# Altium footprint library LTEWlib.PcbLib: 125 footprints (part 2 of 8)
Each footprint in its own frame and in the unit in brackets; x right, y up, seen from the top. Pads: shape width x height; smd on the part's side, far side on the other; paste and mask are expansions set on the pad; w line width, h text height; cw(c..) or ccw(c..) is an arc to the next point about the centre after c.
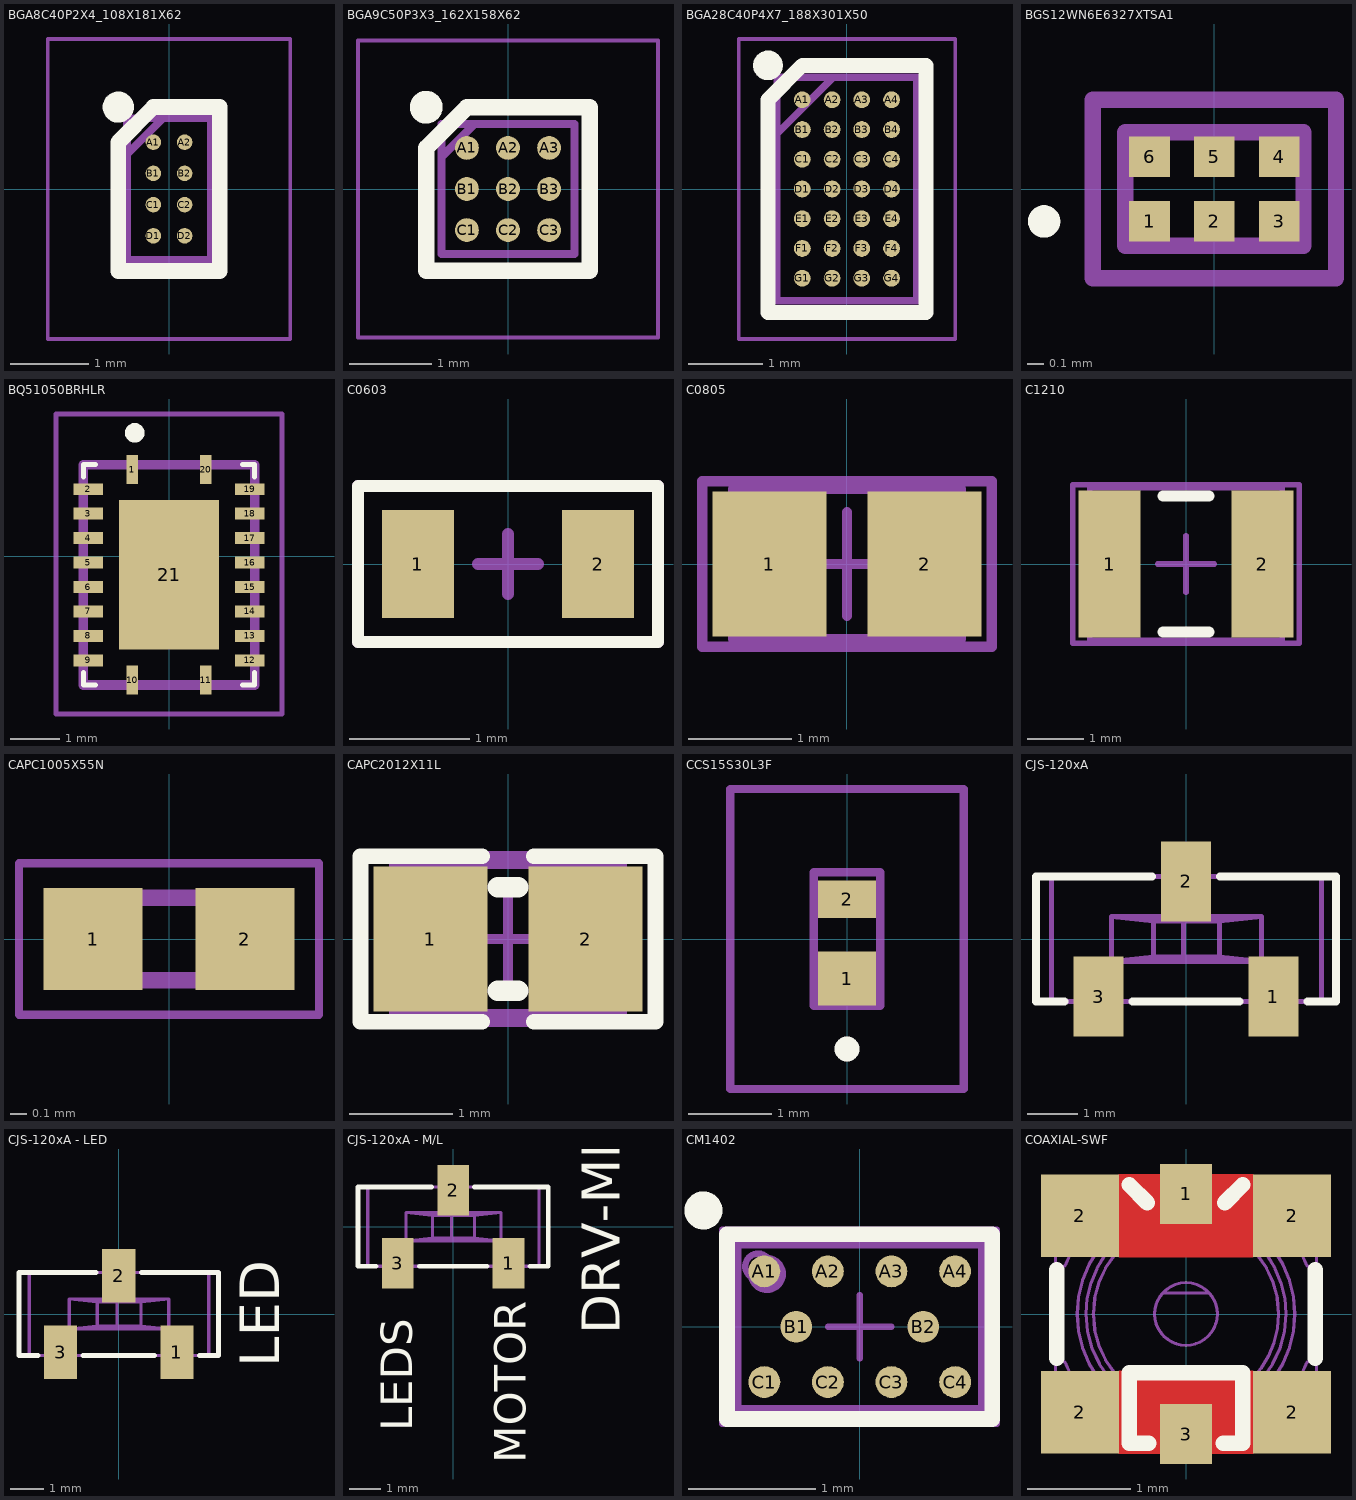
[diagram p1: the footprints below, top view; thin cyan lines are the x and y axes]

## BGA8C40P2X4_108X181X62 [mm]
pads (8):
  round 0.2 smd: A1(-0.2,0.6) A2(0.2,0.6) B1(-0.2,0.2) B2(0.2,0.2) C1(-0.2,-0.2) C2(0.2,-0.2) D1(-0.2,-0.6) D2(0.2,-0.6)
Top Overlay:
  circle w0.2: c-0.65,1.05 r0.1
  lines w0.2: -0.65,-1.05 0.65,-1.05 0.65,1.05 -0.2,1.05 -0.65,0.6 -0.65,-1.05
Mechanical 13:
  lines w0.1: -0.538,0.446 -0.077,0.907 ; -0.538,-0.907 0.538,-0.907 0.538,0.907 -0.538,0.907 -0.538,-0.907
Mechanical 15:
  lines w0.05: -1.553,-1.922 1.553,-1.922 1.553,1.922 -1.553,1.922 -1.553,-1.922
3D body "TPS63036YFGT.stp": height 0.63, standoff 0, extent -0.538,-0.907 0.538,0.907

## BGA9C50P3X3_162X158X62 [mm]
pads (9):
  round 0.29 smd: A1(-0.5,0.5) A2(0,0.5) A3(0.5,0.5) B1(-0.5,0) B2(0,0) B3(0.5,0) C1(-0.5,-0.5) C2(0,-0.5) C3(0.5,-0.5)
Top Overlay:
  circle w0.2: c-0.995,0.995 r0.1
  lines w0.2: -0.995,-0.995 0.995,-0.995 0.995,0.995 -0.5,0.995 -0.995,0.5 -0.995,-0.995
Mechanical 13:
  lines w0.1: -0.81,0.388 -0.408,0.79 ; -0.81,-0.79 0.81,-0.79 0.81,0.79 -0.81,0.79 -0.81,-0.79
Mechanical 15:
  lines w0.05: -1.825,-1.805 1.825,-1.805 1.825,1.805 -1.825,1.805 -1.825,-1.805
3D body "BQ27421YZFR-G1A.stp": height 0.63, standoff 0, extent -0.81,-0.79 0.81,0.79

## BGA28C40P4X7_188X301X50 [mm]
pads (28):
  round 0.226 smd: A1(-0.6,1.2) A2(-0.2,1.2) A3(0.2,1.2) A4(0.6,1.2) B1(-0.6,0.8) B2(-0.2,0.8) B3(0.2,0.8) B4(0.6,0.8) C1(-0.6,0.4) C2(-0.2,0.4) C3(0.2,0.4) C4(0.6,0.4) D1(-0.6,0) D2(-0.2,0) D3(0.2,0) D4(0.6,0) E1(-0.6,-0.4) E2(-0.2,-0.4) E3(0.2,-0.4) E4(0.6,-0.4) F1(-0.6,-0.8) F2(-0.2,-0.8) F3(0.2,-0.8) F4(0.6,-0.8) G1(-0.6,-1.2) G2(-0.2,-1.2) G3(0.2,-1.2) G4(0.6,-1.2)
Top Overlay:
  circle w0.2: c-1.063,1.663 r0.1
  lines w0.2: -1.063,-1.663 1.063,-1.663 1.063,1.663 -0.6,1.663 -1.063,1.2 -1.063,-1.663
Mechanical 13:
  lines w0.1: -0.941,0.744 -0.182,1.503 ; -0.941,-1.503 0.941,-1.503 0.941,1.503 -0.941,1.503 -0.941,-1.503
Mechanical 15:
  lines w0.05: -1.456,-2.018 1.457,-2.018 1.457,2.018 -1.456,2.018 -1.456,-2.018
3D body "BQ51003YFPT.stp": height 0.5, standoff 0, extent -0.941,-1.503 0.941,1.503

## BGS12WN6E6327XTSA1 [mm]
pads (6):
  rect 0.25x0.25 smd: 1(-0.4,-0.2) 2(0,-0.2) 3(0.4,-0.2) 4(0.4,0.2) 5(0,0.2) 6(-0.4,0.2)
Top Overlay:
  lines w0.1: -1.1,-0.2 cw(c-1.05,-0.2) -1,-0.2 cw(c-1.05,-0.2) -1.1,-0.2
Mechanical 13:
  lines w0.1: -0.55,-0.35 0.55,-0.35 0.55,0.35 -0.55,0.35 -0.55,-0.35
Mechanical 15:
  lines w0.1: -0.75,-0.55 0.75,-0.55 0.75,0.55 -0.75,0.55 -0.75,-0.55
3D body "BGS12WN6E6327XTSA1.stp": height 0.5, standoff 0, extent -0.55,-0.35 0.55,0.35

## BQ51050BRHLR [mm]
pads (21):
  rect 0.24x0.6 smd: 1(-0.75,1.775) 10(-0.75,-2.525) 11(0.75,-2.525) 20(0.75,1.775)
  rect 0.6x0.24 smd: 2(-1.65,1.375) 3(-1.65,0.875) 4(-1.65,0.375) 5(-1.65,-0.125) 6(-1.65,-0.625) 7(-1.65,-1.125) 8(-1.65,-1.625) 9(-1.65,-2.125) 12(1.65,-2.125) 13(1.65,-1.625) 14(1.65,-1.125) 15(1.65,-0.625) 16(1.65,-0.125) 17(1.65,0.375) 18(1.65,0.875) 19(1.65,1.375)
  rect 2.05x3.05 smd: 21(0,-0.375)
Top Overlay:
  lines w0.1: -1.75,-2.375 -1.75,-2.625 -1.5,-2.625 ; -1.75,1.625 -1.75,1.875 -1.5,1.875 ; 1.5,-2.625 1.75,-2.625 1.75,-2.375 ; 1.5,1.875 1.75,1.875 1.75,1.625
  lines w0.2: -0.8,2.525 ccw(c-0.7,2.525) -0.6,2.525 ccw(c-0.7,2.525) -0.8,2.525
Mechanical 13:
  lines w0.2: -1.75,-2.625 -1.75,1.875 1.75,1.875 1.75,-2.625 -1.75,-2.625
Mechanical 15:
  lines w0.1: -2.306,-3.219 -2.306,2.91 2.306,2.91 2.306,-3.219 -2.306,-3.219
3D body "BQ51013BRHLR.stp": height 1, standoff 0, extent -1.75,-2.67 1.75,1.83

## C0603 [mm] "SMD 0603"
pads (2):
  rect 0.6x0.9 smd: 1(-0.75,0) 2(0.75,0)
Top Overlay:
  lines w0.1: -1.25,-0.65 -1.25,0.65 1.25,0.65 1.25,-0.65 -1.25,-0.65
Top Courtyard:
  lines w0.1: -0.25,0 0,0 ; 0,-0.25 0,0 ; 0,0.25 0,0 ; 0.25,0 0,0 ; -1.25,-0.65 -1.25,0.65 1.25,0.65 1.25,-0.65 -1.25,-0.65
3D body "User Library-0603 SMD Capacitor.step": height 0.3, standoff 0, extent -0.8,-0.4 0.8,0.4

## C0805 [mm] "Chip Capacitor, Body 2.0x1.3mm, IPC High Density"
height 1.4
pads (2):
  rect 1.1x1.4 smd: 1(-0.75,0) 2(0.75,0)
Top Courtyard:
  lines w0.1: -0.5,0 0.5,0 ; 0,-0.5 0,0.5 ; -1.4,-0.8 -1.4,0.8 1.4,0.8 1.4,-0.8 -1.4,-0.8
Top 3D Body:
  lines w0.1: -1.1,-0.725 -1.1,0.725 1.1,0.725 1.1,-0.725 -1.1,-0.725
3D body: height 1.4, standoff 0, extent -1.1,-0.725 1.1,0.725

## C1210 [mm] "Chip Capacitor, Body 3.2x2.5mm, IPC High Density"
height 1.3
pads (2):
  rect 1.1x2.6 smd: 1(-1.35,0) 2(1.35,0)
Top Overlay:
  lines w0.2: -0.4,-1.2 0.4,-1.2 ; -0.4,1.2 0.4,1.2
Top Courtyard:
  lines w0.1: -0.5,0 0.5,0 ; 0,-0.5 0,0.5 ; -2,-1.4 2,-1.4 2,1.4 -2,1.4 -2,-1.4
Top 3D Body:
  lines w0.1: -1.7,-1.35 1.7,-1.35 1.7,1.35 -1.7,1.35 -1.7,-1.35
3D body: height 1.3, standoff 0, extent -1.7,-1.35 1.7,1.35

## CAPC1005X55N [mm]
pads (2):
  rect 0.6x0.62 smd: 1(-0.46,0) 2(0.46,0)
Mechanical 13:
  lines w0.1: -0.5,-0.25 -0.5,0.25 0.5,0.25 0.5,-0.25 -0.5,-0.25
Mechanical 15:
  lines w0.05: -0.91,-0.46 -0.91,0.46 0.91,0.46 0.91,-0.46 -0.91,-0.46
3D body "GJM1555C1H3R5BB01D.stp": height 0.55, standoff 0, extent -0.5,-0.25 0.5,0.25

## CAPC2012X11L [mm]
pads (2):
  rect 1.1x1.4 smd: 1(-0.75,0) 2(0.75,0)
Top Overlay:
  lines w0.152: -0.25,-0.8 -1.425,-0.8 -1.425,0.8 -0.25,0.8 ; 0.25,-0.8 1.425,-0.8 1.425,0.8 0.25,0.8
  lines w0.2: -0.1,-0.5 0.1,-0.5 ; -0.1,0.5 0.1,0.5
Mechanical 7:
  lines w0.1: -1.1,-0.725 1.1,-0.725 1.1,0.725 -1.1,0.725 -1.1,-0.725
  text ".Designator" at -0.711,-0.152 h0.3
Mechanical 15:
  lines w0.1: -0.5,0 0.5,0 ; 0,-0.5 0,0.5 ; -1.425,-0.8 1.425,-0.8 1.425,0.8 -1.425,0.8 -1.425,-0.8
3D body "SW3dPS-0805 SMD Capacitor.STEP": height 0.77, standoff -0.01, extent -1,-0.625 1,0.625

## CCS15S30L3F [mm]
pads (2):
  rect 0.7x0.65 smd: 1(0,-0.475)
  rect 0.7x0.45 smd: 2(0,0.475)
Top Overlay:
  lines w0.2: 0,-1.37 ccw(c0,-1.32) 0,-1.27 ; 0,-1.37 cw(c0,-1.32) 0,-1.27 ; 0,-1.37 ccw(c0,-1.32) 0,-1.27
Mechanical 13:
  lines w0.1: -0.4,-0.8 0.4,-0.8 0.4,0.8 -0.4,0.8 -0.4,-0.8
Mechanical 15:
  lines w0.1: -1.4,-1.8 1.4,-1.8 1.4,1.8 -1.4,1.8 -1.4,-1.8
3D body "CCS15S30,L3F.stp": height 0.6, standoff 0, extent -0.4,-0.8 0.4,0.8

## CJS-120xA [mm]
pads (3):
  rect 1x1.6 smd: 1(1.75,-1.15) 2(0,1.15) 3(-1.75,-1.15)
Top Overlay:
  lines w0.152: -2.43,-1.25 -3,-1.25 -3,1.25 -0.68,1.25 ; -1.07,-1.25 1.07,-1.25 ; 0.68,1.25 3,1.25 3,-1.25 2.43,-1.25
Mechanical 7:
  lines w0.1: -2.04,-1.25 -2.04,-1.4 -1.44,-1.4 -1.44,-1.25 ; -0.29,1.25 -0.29,1.4 0.31,1.4 0.31,1.25 ; 0.07,-0.36 -0.65,-0.36 ; 0.07,0.36 -0.65,0.36 ; 1.46,-1.25 1.46,-1.4 2.06,-1.4 2.06,-1.25 ; -1.49,-0.45 -1.49,0.45 ; -1.49,-0.45 1.51,-0.45 ; -1.49,-0.45 -0.65,-0.36 ; -1.49,0.45 1.51,0.45 ; -1.49,0.45 -0.65,0.36 ; -0.65,-0.36 -0.65,0.36 ; 0.67,-0.36 0.67,0.36 ; 0.67,-0.36 -0.05,-0.36 -0.05,0.36 0.67,0.36 ; 0.67,-0.36 1.51,-0.45 ; 0.67,0.36 1.51,0.45 ; 1.51,-0.45 1.51,0.45 ; -2.69,-1.25 -2.69,1.25 2.71,1.25 2.71,-1.25 -2.69,-1.25
  text ".Designator" at -0.775,-1 h0.38
3D body "User Library-CJS-1200TA -Copal Electronics -SPDT Micro Slide Switch.step": height 2.5, standoff 0, extent -3,-1.4 3,1.45

## CJS-120xA - LED [mm]
pads (3):
  rect 1x1.6 smd: 1(1.75,-1.15) 2(0,1.15) 3(-1.75,-1.15)
Top Overlay:
  lines w0.152: -2.43,-1.25 -3,-1.25 -3,1.25 -0.68,1.25 ; -1.07,-1.25 1.07,-1.25 ; 0.68,1.25 3,1.25 3,-1.25 2.43,-1.25
  text "LED" at 4.826,-1.599 h1.2
Mechanical 7:
  lines w0.1: -2.04,-1.25 -2.04,-1.4 -1.44,-1.4 -1.44,-1.25 ; -0.29,1.25 -0.29,1.4 0.31,1.4 0.31,1.25 ; 0.07,-0.36 -0.65,-0.36 ; 0.07,0.36 -0.65,0.36 ; 1.46,-1.25 1.46,-1.4 2.06,-1.4 2.06,-1.25 ; -1.49,-0.45 -1.49,0.45 ; -1.49,-0.45 1.51,-0.45 ; -1.49,-0.45 -0.65,-0.36 ; -1.49,0.45 1.51,0.45 ; -1.49,0.45 -0.65,0.36 ; -0.65,-0.36 -0.65,0.36 ; 0.67,-0.36 0.67,0.36 ; 0.67,-0.36 -0.05,-0.36 -0.05,0.36 0.67,0.36 ; 0.67,-0.36 1.51,-0.45 ; 0.67,0.36 1.51,0.45 ; 1.51,-0.45 1.51,0.45 ; -2.69,-1.25 -2.69,1.25 2.71,1.25 2.71,-1.25 -2.69,-1.25
  text ".Designator" at -0.775,-1 h0.38
3D body "User Library-CJS-1200TA -Copal Electronics -SPDT Micro Slide Switch.step": height 2.5, standoff 0, extent -3,-1.4 3,1.45

## CJS-120xA - M/L [mm]
pads (3):
  rect 1x1.6 smd: 1(1.75,-1.15) 2(0,1.15) 3(-1.75,-1.15)
Top Overlay:
  lines w0.152: -2.43,-1.25 -3,-1.25 -3,1.25 -0.68,1.25 ; -1.07,-1.25 1.07,-1.25 ; 0.68,1.25 3,1.25 3,-1.25 2.43,-1.25
  text "DRV-ML" at 5.264,-3.399 h1.2
  text "LEDS" at -1.286,-6.459 h1
  text "MOTOR" at 2.286,-7.459 h1
Mechanical 7:
  lines w0.1: -2.04,-1.25 -2.04,-1.4 -1.44,-1.4 -1.44,-1.25 ; -0.29,1.25 -0.29,1.4 0.31,1.4 0.31,1.25 ; 0.07,-0.36 -0.65,-0.36 ; 0.07,0.36 -0.65,0.36 ; 1.46,-1.25 1.46,-1.4 2.06,-1.4 2.06,-1.25 ; -1.49,-0.45 -1.49,0.45 ; -1.49,-0.45 1.51,-0.45 ; -1.49,-0.45 -0.65,-0.36 ; -1.49,0.45 1.51,0.45 ; -1.49,0.45 -0.65,0.36 ; -0.65,-0.36 -0.65,0.36 ; 0.67,-0.36 0.67,0.36 ; 0.67,-0.36 -0.05,-0.36 -0.05,0.36 0.67,0.36 ; 0.67,-0.36 1.51,-0.45 ; 0.67,0.36 1.51,0.45 ; 1.51,-0.45 1.51,0.45 ; -2.69,-1.25 -2.69,1.25 2.71,1.25 2.71,-1.25 -2.69,-1.25
  text ".Designator" at -0.775,-1 h0.38
3D body "User Library-CJS-1200TA -Copal Electronics -SPDT Micro Slide Switch.step": height 2.5, standoff 0, extent -3,-1.4 3,1.45

## CM1402 [mm]
pads (10):
  round 0.25 smd mask+0.05: A1(-0.75,0.435) A2(-0.25,0.435) A3(0.25,0.435) A4(0.75,0.435) B1(-0.5,0) B2(0.5,0) C1(-0.75,-0.435) C2(-0.25,-0.435) C3(0.25,-0.435) C4(0.75,-0.435)
Top Overlay:
  circle w0.2: c-1.23,0.915 r0.05
  lines w0.125: -1.042,-0.727 1.042,-0.727 1.042,0.727 -1.042,0.727 -1.042,-0.727
Mechanical 7:
  circle w0.2: c-0.73,0.415 r0.05
  lines w0.1: -0.98,-0.665 -0.98,0.665 0.98,0.665 0.98,-0.665 -0.98,-0.665
  text ".Designator" at -0.533,-0.127 h0.3
Mechanical 15:
  circle w0.05: c-0.8,0.475 r0.1
  lines w0.05: -0.25,0 0.25,0 ; 0,-0.25 0,0.25 ; -1.08,-0.765 1.08,-0.765 1.08,0.765 -1.08,0.765 -1.08,-0.765
3D body: height 0.72, standoff 0.21, extent -0.98,-0.665 0.98,0.665

## COAXIAL-SWF [mm]
pads (6):
  rect 0.5x0.58 smd: 1(0,1.16) 3(0,-1.16)
  rect 0.75x0.8 smd: 2(-1.025,-0.95) 2(-1.025,0.95) 2(1.025,-0.95) 2(1.025,0.95)
Top Layer:
  pour cut-out: -0.65,0.55 0.65,0.55 0.65,1.35 -0.65,1.35
  pour cut-out: 0.65,-0.55 -0.65,-0.55 -0.65,-1.35 0.65,-1.35
Top Overlay:
  lines w0.15: -1.25,-0.43 -1.25,0.43 ; -0.55,1.25 -0.375,1.075 ; -0.36,-1.25 -0.55,-1.25 -0.55,-0.57 0.55,-0.57 0.55,-1.25 0.36,-1.25 ; 0.375,1.075 0.55,1.25 ; 1.25,-0.43 1.25,0.43
Mechanical 7:
  drawing of 206 lines, arcs and shapes, not listed
  text ".Designator" at -0.785,-0.7 h0.38
3D body: height 0.15, standoff 0, extent -0.227,-1.301 0.227,-0.758
3D body: height 0.15, standoff 0, extent -0.227,0.899 0.227,1.299
3D body: height 0.6, standoff 0.55, extent -1.262,-1.248 1.262,1.251
3D body: height 1.4, standoff 0.6, extent -0.9,-0.9 0.9,0.901
3D body: height 0.75, standoff 0.6, extent -1.05,-1.049 1.05,1.05
3D body: height 0.95, standoff 0.75, extent -1,-0.999 1,1.001
3D body: height 0.6, standoff 0, extent 0.757,0.655 1.262,1.249
3D body: height 0.6, standoff 0, extent 0.757,-1.246 1.262,-0.653
3D body: height 0.6, standoff 0, extent -1.262,-1.25 -0.757,-0.649
3D body: height 0.6, standoff 0, extent -1.262,0.655 -0.757,1.248
3D body: height 0.55, standoff 0.1, extent -1.262,-1.252 1.262,1.253
3D body: height 0.9, standoff 0.6, extent -1.05,-1.049 1.05,1.05
3D body: height 1.25, standoff 0.95, extent -1.05,-1.049 1.05,1.05
3D body: height 1.55, standoff 1.25, extent -1.05,-1.05 1.05,1.05